# Altium footprint library Cyberdeck.PcbLib: 261 footprints (part 4 of 17)
Each footprint in its own frame and in the unit in brackets; x right, y up, seen from the top. Pads: shape width x height; smd on the part's side, far side on the other; paste and mask are expansions set on the pad; w line width, h text height; cw(c..) or ccw(c..) is an arc to the next point about the centre after c.
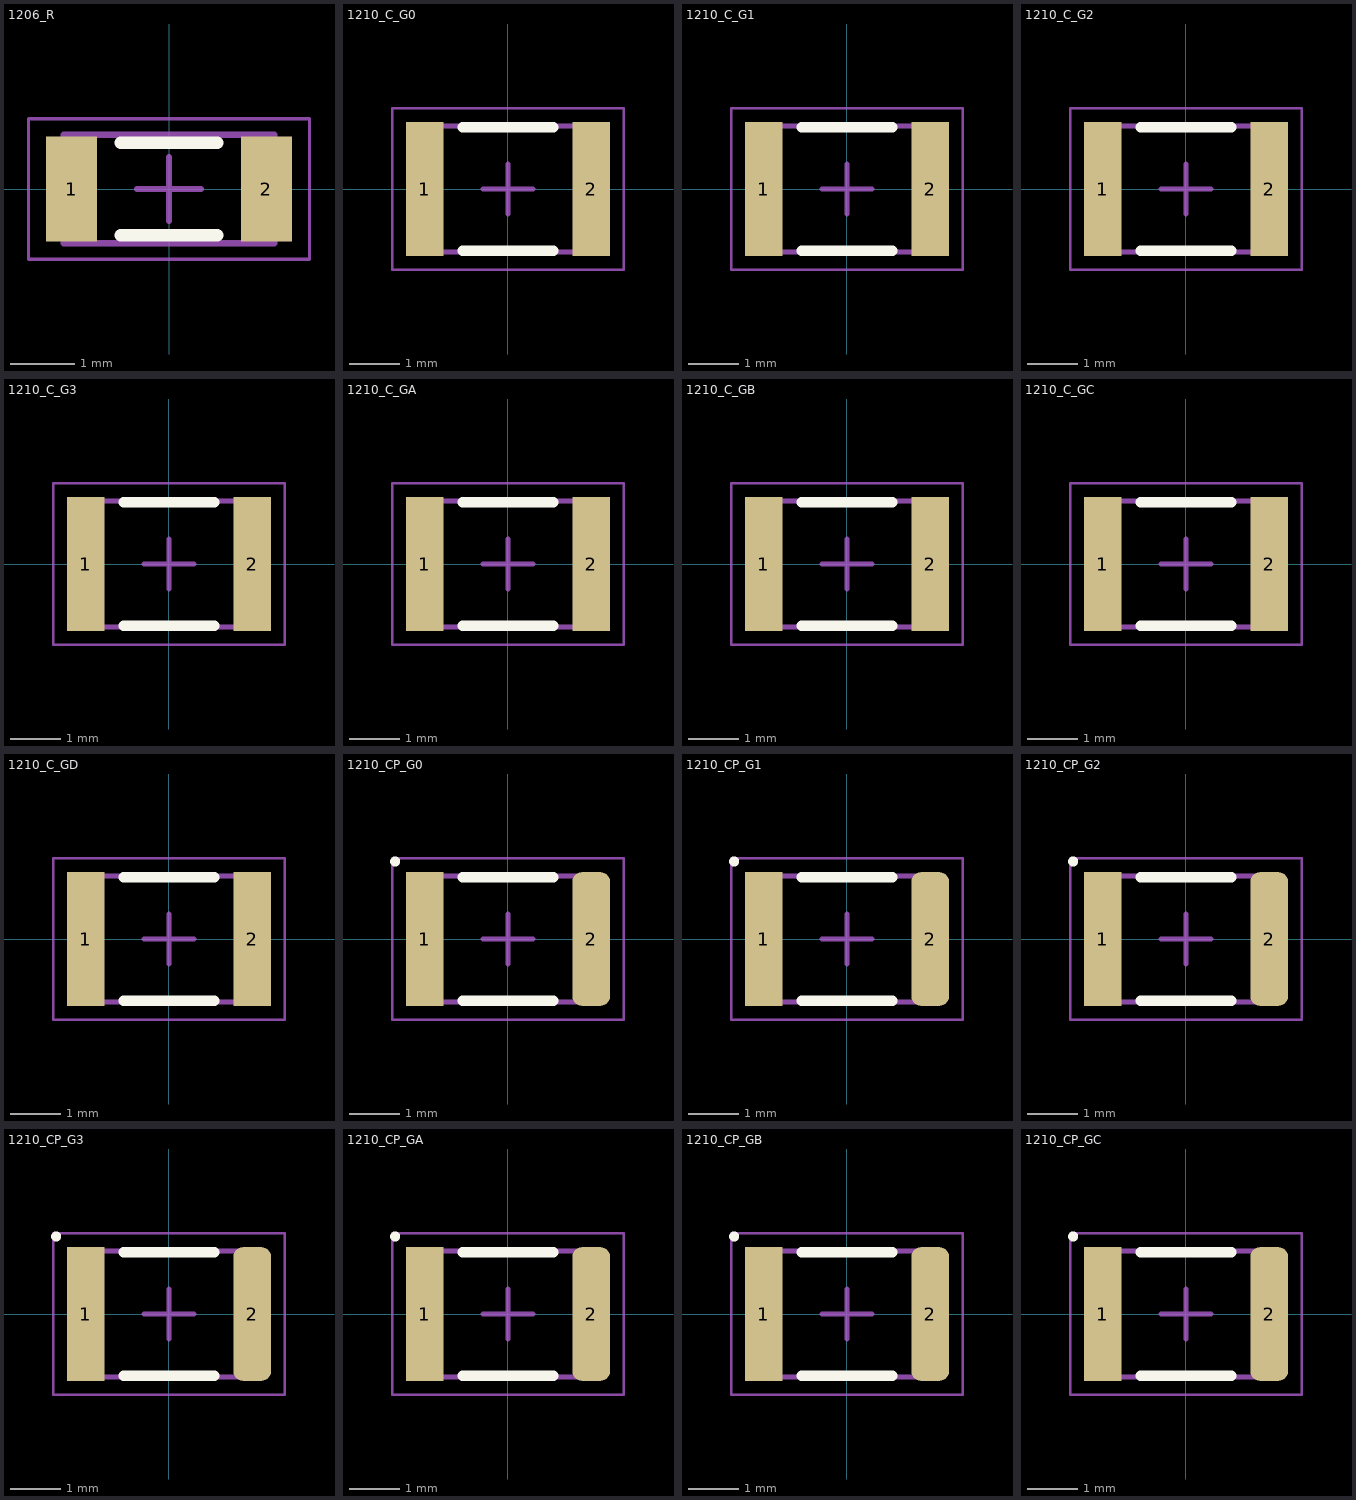
[diagram p3: the footprints below, top view; thin cyan lines are the x and y axes]

## 1206_R [mm] "1206_R"
height 0.55
pads (2):
  rect 0.8x1.65 smd: 1(-1.525,0) 2(1.525,0)
Top Overlay:
  lines w0.2: -0.75,-0.725 0.75,-0.725 ; -0.75,0.725 0.75,0.725
Assembly Top:
  lines w0.1: -1.65,-0.85 -1.65,0.85 1.65,0.85 1.65,-0.85 -1.65,-0.85
Courtyard Top:
  lines w0.05: -2.2,-1.1 -2.2,1.1 2.2,1.1 2.2,-1.1 -2.2,-1.1
  lines w0.1: -0.5,0 0.5,0 ; 0,-0.5 0,0.5
3D body "RESC-1206.stp": height 0.65, standoff 0, extent -1.65,-0.85 1.65,0.85

## 1210_C_G0 [mm] "1210_C_G0"
height 0.85
pads (2):
  rect 0.75x2.65 smd: 1(-1.65,0) 2(1.65,0)
Top Overlay:
  lines w0.2: -0.9,-1.225 0.9,-1.225 ; -0.9,1.225 0.9,1.225
Assembly Top:
  lines w0.1: -1.6,-1.25 -1.6,1.25 1.6,1.25 1.6,-1.25 -1.6,-1.25
Courtyard Top:
  lines w0.05: -2.3,-1.6 -2.3,1.6 2.3,1.6 2.3,-1.6 -2.3,-1.6
  lines w0.1: -0.5,0 0.5,0 ; 0,-0.5 0,0.5
3D body: height 0.85, standoff 0, extent -1.35,-1.25 1.35,1.25
3D body: height 0.85, standoff 0, extent -1.6,-1.25 -1.35,1.25
3D body: height 0.85, standoff 0, extent 1.35,-1.25 1.6,1.25

## 1210_C_G1 [mm] "1210_C_G1"
height 1.15
pads (2):
  rect 0.75x2.65 smd: 1(-1.65,0) 2(1.65,0)
Top Overlay:
  lines w0.2: -0.9,-1.225 0.9,-1.225 ; -0.9,1.225 0.9,1.225
Assembly Top:
  lines w0.1: -1.6,-1.25 -1.6,1.25 1.6,1.25 1.6,-1.25 -1.6,-1.25
Courtyard Top:
  lines w0.05: -2.3,-1.6 -2.3,1.6 2.3,1.6 2.3,-1.6 -2.3,-1.6
  lines w0.1: -0.5,0 0.5,0 ; 0,-0.5 0,0.5
3D body: height 1.15, standoff 0, extent -1.35,-1.25 1.35,1.25
3D body: height 1.15, standoff 0, extent -1.6,-1.25 -1.35,1.25
3D body: height 1.15, standoff 0, extent 1.35,-1.25 1.6,1.25

## 1210_C_G2 [mm] "1210_C_G2"
height 1.6
pads (2):
  rect 0.75x2.65 smd: 1(-1.65,0) 2(1.65,0)
Top Overlay:
  lines w0.2: -0.9,-1.225 0.9,-1.225 ; -0.9,1.225 0.9,1.225
Assembly Top:
  lines w0.1: -1.6,-1.25 1.6,-1.25 1.6,1.25 -1.6,1.25 -1.6,-1.25
Courtyard Top:
  lines w0.05: -2.3,-1.6 2.3,-1.6 2.3,1.6 -2.3,1.6 -2.3,-1.6
  lines w0.1: -0.5,0 0.5,0 ; 0,-0.5 0,0.5
3D body: height 1.6, standoff 0, extent 1.35,-1.25 1.6,1.25
3D body: height 1.6, standoff 0, extent -1.6,-1.25 -1.35,1.25
3D body: height 1.6, standoff 0, extent -1.35,-1.25 1.35,1.25

## 1210_C_G3 [mm] "1210_C_G3"
height 2
pads (2):
  rect 0.75x2.65 smd: 1(-1.65,0) 2(1.65,0)
Top Overlay:
  lines w0.2: -0.9,-1.225 0.9,-1.225 ; -0.9,1.225 0.9,1.225
Assembly Top:
  lines w0.1: -1.6,-1.25 -1.6,1.25 1.6,1.25 1.6,-1.25 -1.6,-1.25
Courtyard Top:
  lines w0.05: -2.3,-1.6 -2.3,1.6 2.3,1.6 2.3,-1.6 -2.3,-1.6
  lines w0.1: -0.5,0 0.5,0 ; 0,-0.5 0,0.5
3D body: height 2, standoff 0, extent -1.35,-1.25 1.35,1.25
3D body: height 2, standoff 0, extent -1.6,-1.25 -1.35,1.25
3D body: height 2, standoff 0, extent 1.35,-1.25 1.6,1.25

## 1210_C_GA [mm] "1210_C_GA"
height 1.25
pads (2):
  rect 0.75x2.65 smd: 1(-1.65,0) 2(1.65,0)
Top Overlay:
  lines w0.2: -0.9,-1.225 0.9,-1.225 ; -0.9,1.225 0.9,1.225
Assembly Top:
  lines w0.1: -1.6,-1.25 1.6,-1.25 1.6,1.25 -1.6,1.25 -1.6,-1.25
Courtyard Top:
  lines w0.05: -2.3,-1.6 2.3,-1.6 2.3,1.6 -2.3,1.6 -2.3,-1.6
  lines w0.1: -0.5,0 0.5,0 ; 0,-0.5 0,0.5
3D body: height 1.25, standoff 0, extent 1.35,-1.25 1.6,1.25
3D body: height 1.25, standoff 0, extent -1.6,-1.25 -1.35,1.25
3D body: height 1.25, standoff 0, extent -1.35,-1.25 1.35,1.25

## 1210_C_GB [mm] "1210_C_GB"
height 1.9
pads (2):
  rect 0.75x2.65 smd: 1(-1.65,0) 2(1.65,0)
Top Overlay:
  lines w0.2: -0.9,-1.225 0.9,-1.225 ; -0.9,1.225 0.9,1.225
Assembly Top:
  lines w0.1: -1.6,-1.25 -1.6,1.25 1.6,1.25 1.6,-1.25 -1.6,-1.25
Courtyard Top:
  lines w0.05: -2.3,-1.6 -2.3,1.6 2.3,1.6 2.3,-1.6 -2.3,-1.6
  lines w0.1: -0.5,0 0.5,0 ; 0,-0.5 0,0.5
3D body: height 1.9, standoff 0, extent -1.35,-1.25 1.35,1.25
3D body: height 1.9, standoff 0, extent -1.6,-1.25 -1.35,1.25
3D body: height 1.9, standoff 0, extent 1.35,-1.25 1.6,1.25

## 1210_C_GC [mm] "1210_C_GC"
height 2.5
pads (2):
  rect 0.75x2.65 smd: 1(-1.65,0) 2(1.65,0)
Top Overlay:
  lines w0.2: -0.9,-1.225 0.9,-1.225 ; -0.9,1.225 0.9,1.225
Assembly Top:
  lines w0.1: -1.6,-1.25 -1.6,1.25 1.6,1.25 1.6,-1.25 -1.6,-1.25
Courtyard Top:
  lines w0.05: -2.3,-1.6 -2.3,1.6 2.3,1.6 2.3,-1.6 -2.3,-1.6
  lines w0.1: -0.5,0 0.5,0 ; 0,-0.5 0,0.5
3D body: height 2.5, standoff 0, extent -1.35,-1.25 1.35,1.25
3D body: height 2.5, standoff 0, extent -1.6,-1.25 -1.35,1.25
3D body: height 2.5, standoff 0, extent 1.35,-1.25 1.6,1.25

## 1210_C_GD [mm] "1210_C_GD"
height 2.5
pads (2):
  rect 0.75x2.65 smd: 1(-1.65,0) 2(1.65,0)
Top Overlay:
  lines w0.2: -0.9,-1.225 0.9,-1.225 ; -0.9,1.225 0.9,1.225
Assembly Top:
  lines w0.1: -1.6,-1.25 1.6,-1.25 1.6,1.25 -1.6,1.25 -1.6,-1.25
Courtyard Top:
  lines w0.05: -2.3,-1.6 2.3,-1.6 2.3,1.6 -2.3,1.6 -2.3,-1.6
  lines w0.1: -0.5,0 0.5,0 ; 0,-0.5 0,0.5
3D body: height 2.5, standoff 0, extent 1.35,-1.25 1.6,1.25
3D body: height 2.5, standoff 0, extent -1.6,-1.25 -1.35,1.25
3D body: height 2.5, standoff 0, extent -1.35,-1.25 1.35,1.25

## 1210_CP_G0 [mm] "1210_CP_G0"
height 0.85
pads (2):
  rect 0.75x2.65 smd: 1(-1.65,0)
  rrect50% 0.75x2.65 smd: 2(1.65,0)
Top Overlay:
  circle w0.1: c-2.237,1.537 r0.05
  lines w0.2: -0.9,-1.225 0.9,-1.225 ; -0.9,1.225 0.9,1.225
Assembly Top:
  lines w0.1: -1.6,-1.25 -1.6,1.25 1.6,1.25 1.6,-1.25 -1.6,-1.25
Courtyard Top:
  lines w0.05: -2.3,-1.6 -2.3,1.6 2.3,1.6 2.3,-1.6 -2.3,-1.6
  lines w0.1: -0.5,0 0.5,0 ; 0,-0.5 0,0.5
3D body: height 0.85, standoff 0, extent -1.35,-1.25 1.35,1.25
3D body: height 0.85, standoff 0, extent -1.6,-1.25 -1.35,1.25
3D body: height 0.85, standoff 0, extent 1.35,-1.25 1.6,1.25

## 1210_CP_G1 [mm] "1210_CP_G1"
height 1.15
pads (2):
  rect 0.75x2.65 smd: 1(-1.65,0)
  rrect50% 0.75x2.65 smd: 2(1.65,0)
Top Overlay:
  circle w0.1: c-2.237,1.537 r0.05
  lines w0.2: -0.9,-1.225 0.9,-1.225 ; -0.9,1.225 0.9,1.225
Assembly Top:
  lines w0.1: -1.6,-1.25 1.6,-1.25 1.6,1.25 -1.6,1.25 -1.6,-1.25
Courtyard Top:
  lines w0.05: -2.3,-1.6 2.3,-1.6 2.3,1.6 -2.3,1.6 -2.3,-1.6
  lines w0.1: -0.5,0 0.5,0 ; 0,-0.5 0,0.5
3D body: height 1.15, standoff 0, extent 1.35,-1.25 1.6,1.25
3D body: height 1.15, standoff 0, extent -1.6,-1.25 -1.35,1.25
3D body: height 1.15, standoff 0, extent -1.35,-1.25 1.35,1.25

## 1210_CP_G2 [mm] "1210_CP_G2"
height 1.6
pads (2):
  rect 0.75x2.65 smd: 1(-1.65,0)
  rrect50% 0.75x2.65 smd: 2(1.65,0)
Top Overlay:
  circle w0.1: c-2.237,1.537 r0.05
  lines w0.2: -0.9,-1.225 0.9,-1.225 ; -0.9,1.225 0.9,1.225
Assembly Top:
  lines w0.1: -1.6,-1.25 -1.6,1.25 1.6,1.25 1.6,-1.25 -1.6,-1.25
Courtyard Top:
  lines w0.05: -2.3,-1.6 -2.3,1.6 2.3,1.6 2.3,-1.6 -2.3,-1.6
  lines w0.1: -0.5,0 0.5,0 ; 0,-0.5 0,0.5
3D body: height 1.6, standoff 0, extent -1.35,-1.25 1.35,1.25
3D body: height 1.6, standoff 0, extent -1.6,-1.25 -1.35,1.25
3D body: height 1.6, standoff 0, extent 1.35,-1.25 1.6,1.25

## 1210_CP_G3 [mm] "1210_CP_G3"
height 2
pads (2):
  rect 0.75x2.65 smd: 1(-1.65,0)
  rrect50% 0.75x2.65 smd: 2(1.65,0)
Top Overlay:
  circle w0.1: c-2.237,1.537 r0.05
  lines w0.2: -0.9,-1.225 0.9,-1.225 ; -0.9,1.225 0.9,1.225
Assembly Top:
  lines w0.1: -1.6,-1.25 -1.6,1.25 1.6,1.25 1.6,-1.25 -1.6,-1.25
Courtyard Top:
  lines w0.05: -2.3,-1.6 -2.3,1.6 2.3,1.6 2.3,-1.6 -2.3,-1.6
  lines w0.1: -0.5,0 0.5,0 ; 0,-0.5 0,0.5
3D body: height 2, standoff 0, extent -1.35,-1.25 1.35,1.25
3D body: height 2, standoff 0, extent -1.6,-1.25 -1.35,1.25
3D body: height 2, standoff 0, extent 1.35,-1.25 1.6,1.25

## 1210_CP_GA [mm] "1210_CP_GA"
height 1.25
pads (2):
  rect 0.75x2.65 smd: 1(-1.65,0)
  rrect50% 0.75x2.65 smd: 2(1.65,0)
Top Overlay:
  circle w0.1: c-2.237,1.537 r0.05
  lines w0.2: -0.9,-1.225 0.9,-1.225 ; -0.9,1.225 0.9,1.225
Assembly Top:
  lines w0.1: -1.6,-1.25 1.6,-1.25 1.6,1.25 -1.6,1.25 -1.6,-1.25
Courtyard Top:
  lines w0.05: -2.3,-1.6 2.3,-1.6 2.3,1.6 -2.3,1.6 -2.3,-1.6
  lines w0.1: -0.5,0 0.5,0 ; 0,-0.5 0,0.5
3D body: height 1.25, standoff 0, extent 1.35,-1.25 1.6,1.25
3D body: height 1.25, standoff 0, extent -1.6,-1.25 -1.35,1.25
3D body: height 1.25, standoff 0, extent -1.35,-1.25 1.35,1.25

## 1210_CP_GB [mm] "1210_CP_GB"
height 1.9
pads (2):
  rect 0.75x2.65 smd: 1(-1.65,0)
  rrect50% 0.75x2.65 smd: 2(1.65,0)
Top Overlay:
  circle w0.1: c-2.237,1.537 r0.05
  lines w0.2: -0.9,-1.225 0.9,-1.225 ; -0.9,1.225 0.9,1.225
Assembly Top:
  lines w0.1: -1.6,-1.25 -1.6,1.25 1.6,1.25 1.6,-1.25 -1.6,-1.25
Courtyard Top:
  lines w0.05: -2.3,-1.6 -2.3,1.6 2.3,1.6 2.3,-1.6 -2.3,-1.6
  lines w0.1: -0.5,0 0.5,0 ; 0,-0.5 0,0.5
3D body: height 1.9, standoff 0, extent -1.35,-1.25 1.35,1.25
3D body: height 1.9, standoff 0, extent -1.6,-1.25 -1.35,1.25
3D body: height 1.9, standoff 0, extent 1.35,-1.25 1.6,1.25

## 1210_CP_GC [mm] "1210_CP_GC"
height 2.5
pads (2):
  rect 0.75x2.65 smd: 1(-1.65,0)
  rrect50% 0.75x2.65 smd: 2(1.65,0)
Top Overlay:
  circle w0.1: c-2.237,1.537 r0.05
  lines w0.2: -0.9,-1.225 0.9,-1.225 ; -0.9,1.225 0.9,1.225
Assembly Top:
  lines w0.1: -1.6,-1.25 1.6,-1.25 1.6,1.25 -1.6,1.25 -1.6,-1.25
Courtyard Top:
  lines w0.05: -2.3,-1.6 2.3,-1.6 2.3,1.6 -2.3,1.6 -2.3,-1.6
  lines w0.1: -0.5,0 0.5,0 ; 0,-0.5 0,0.5
3D body: height 2.5, standoff 0, extent 1.35,-1.25 1.6,1.25
3D body: height 2.5, standoff 0, extent -1.6,-1.25 -1.35,1.25
3D body: height 2.5, standoff 0, extent -1.35,-1.25 1.35,1.25